# Altium footprint library heromap.PcbLib: 593 footprints (part 27 of 38)
Each footprint in its own frame and in the unit in brackets; x right, y up, seen from the top. Pads: shape width x height; smd on the part's side, far side on the other; paste and mask are expansions set on the pad; w line width, h text height; cw(c..) or ccw(c..) is an arc to the next point about the centre after c.
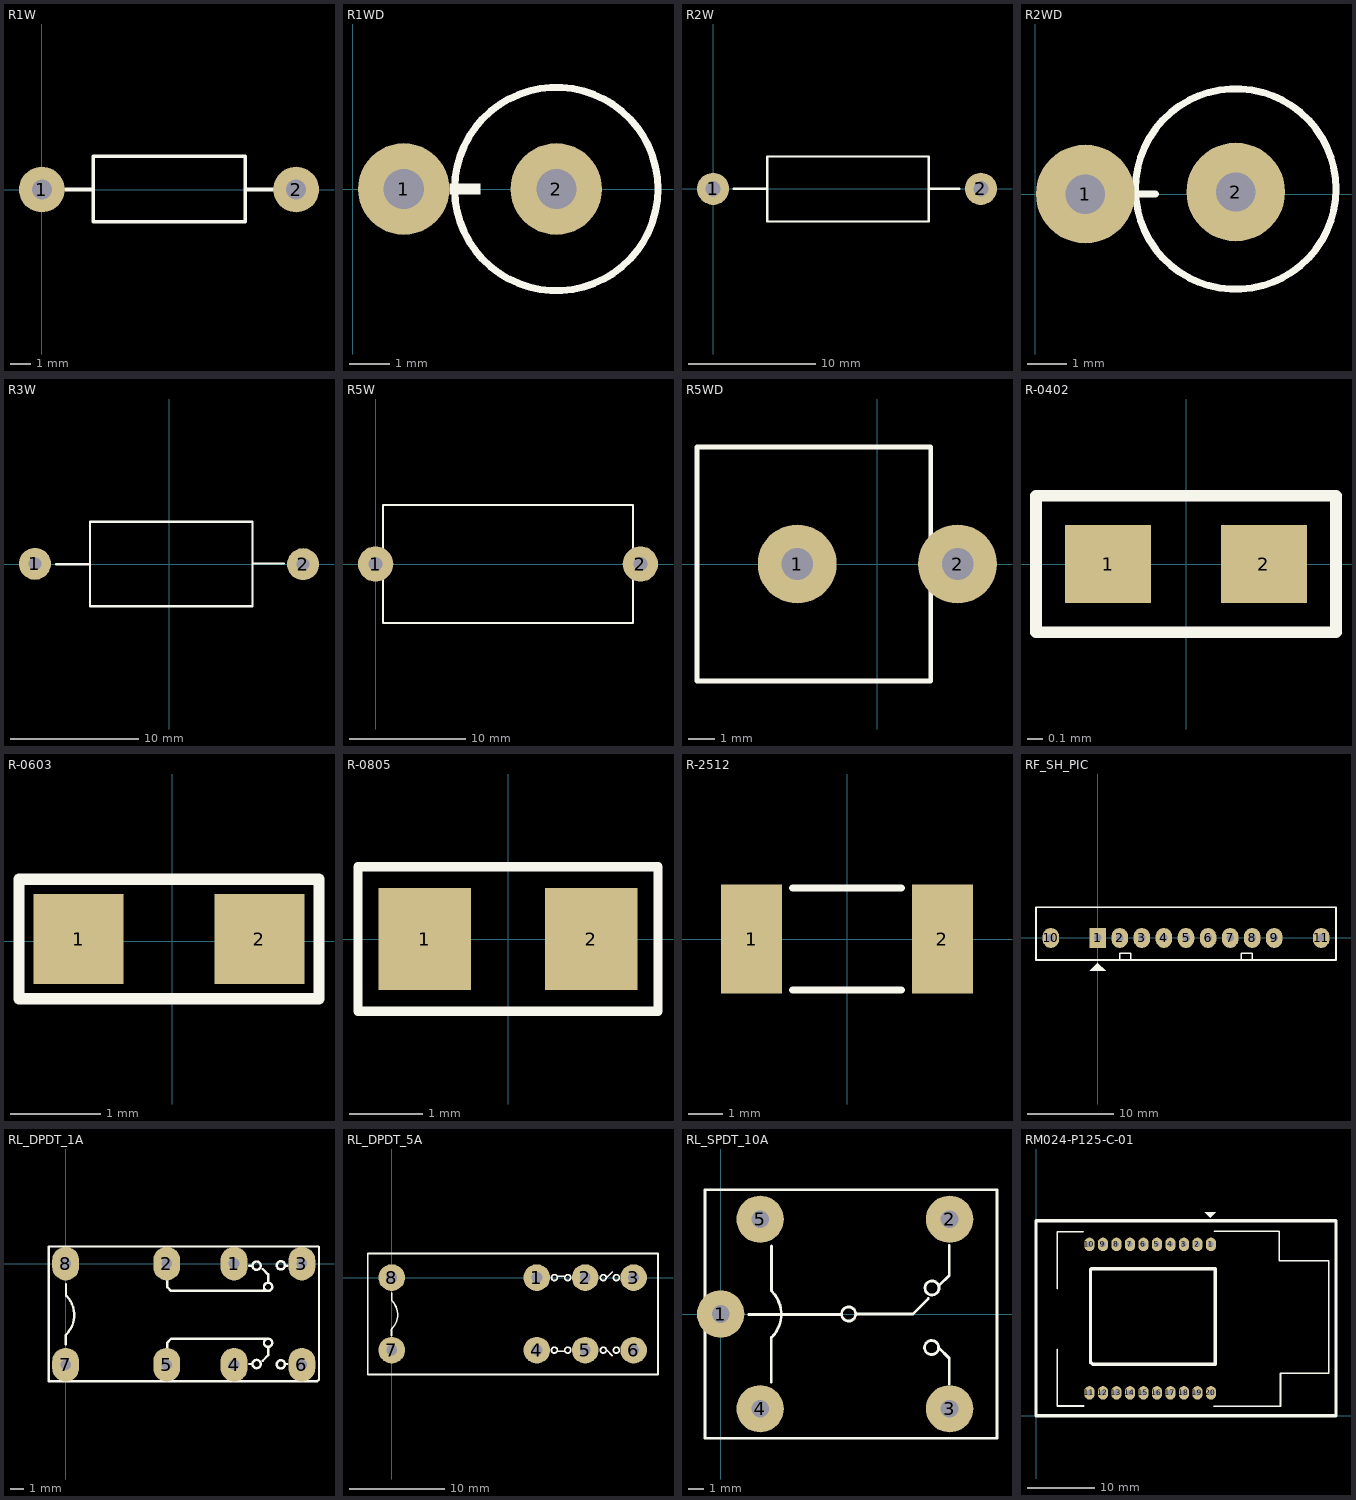
[diagram p26: the footprints below, top view; thin cyan lines are the x and y axes]

## R1W [mil] "R 1W, 2 pin, 500mil"
height 100
pads (2):
  round 90 hole 39.37: 1(0,0) 2(500,0)
Top Overlay:
  lines w7: 46,0 101,0 ; 400,0 460,0 ; 101,0 101,65 400,65 400,-63 101,-63 101,0

## R1WD [mil] "R 1W, 2 pin, 500mil"
height 100
pads (2):
  round 90 hole 39.37: 1(50,0) 2(200,0)
Top Overlay:
  circle w7: c200,0 r100
  region: 125,5 125,-5 95,-5 95,5

## R2W [mm] "R2W, 2 pin, 700mil"
height 5.08
pads (2):
  round 2.54 hole 1.2: 1(0,0) 2(21.107,0)
Top Overlay:
  lines w0.178: 1.626,0 4.267,0 ; 17.018,0 19.406,0 ; 4.267,0 4.267,2.54 16.993,2.54 16.993,-2.565 4.267,-2.565 4.267,0
3D body "SW3dPS-AXIAL_RESISTOR(3W).STEP": height 8.3, standoff -2, extent -0.6,-3.3 21.6,3.3

## R2WD [mm] "R2W, 2 pin, 700mil"
height 5.08
pads (2):
  round 2.5 hole 1: 1(1.27,0) 2(5.08,0.051)
Top Overlay:
  circle w0.178: c5.08,0.127 r2.54
  lines w0.178: 2.159,0 3.048,0

## R3W [mm] "R2W, 2 pin, 700mil"
height 5.08
pads (2):
  round 2.5 hole 1: 1(-10.503,0.013) 2(10.503,-0.013)
Top Overlay:
  lines w0.178: -8.826,-0.013 -6.185,-0.013 ; 6.566,0.038 9.004,0.038 ; -6.185,-3.315 6.54,-3.315 6.54,3.315 -6.185,3.315 -6.185,0.038 -6.185,-3.315
3D body "SW3dPS-AXIAL_RESISTOR(3W).STEP": height 8.3, standoff -2, extent -11.113,-3.289 11.087,3.311

## R5W [mil] "R5W , 2 pin, 400 x 950mil"
height 400
pads (2):
  round 120 hole 47.24: 1(0,0) 2(900,0)
Top Overlay:
  lines w7: 25,-200 875,-200 875,200 25,200 25,-200
3D body "User Library-5W Resistor.STEP": height 362.6, standoff -98.43, extent -84.69,-190 954.68,191.89

## R5WD [mm] "R5W , 2 pin, 300 x 600 mil"
height 10.16
pads (2):
  round 3 hole 1.2: 1(-3.048,0) 2(3.048,0)
Top Overlay:
  lines w0.178: -6.858,-4.445 -6.858,4.445 2.032,4.445 2.032,-4.445 -6.858,-4.445
3D body "SW3dPS-5W Res.STEP": height 23.05, standoff -2.4, extent -8.648,-5.08 4.432,4.92

## R-0402 [mil]
pads (2):
  rect 22x20 smd: 1(-20,0) 2(20,0)
Top Overlay:
  lines w3: -38.5,-17.5 38.5,-17.5 38.5,17.5 -38.5,17.5 -38.5,-17.5
3D body: height 11.81, standoff 0.98, extent -20,-10 20,10
3D body: height 12.2, standoff 0, extent -21.5,-10.5 -18.5,10.5
3D body: height 12.2, standoff 0, extent 18.49,-10.51 21.49,10.49

## R-0603 [mm] "Chip Capacitor; Body 1.6 x 0.8 mm (LxW typ)"
height 0.87
pads (2):
  rect 1x1 smd: 1(-1.041,0.025) 2(0.965,0.025)
Top Overlay:
  lines w0.127: -1.702,-0.635 1.626,-0.635 1.626,0.686 -1.702,0.686 -1.702,-0.635
3D body "User Library-RESC1608X05N.STEP": height 0.45, standoff 0, extent -0.8,-0.399 0.75,0.451

## R-0805 [mil] "Compoment SMD 80x50mil"
height 50
pads (2):
  rect 50x55 smd: 1(-45,0) 2(45,0)
Top Overlay:
  lines w5: -81,-39 81,-39 81,39 -81,39 -81,-39
3D body "SW3dPS-0805 SMD Resistor.STEP": height 30.79, standoff 0, extent -39.36,-24.6 39.38,24.61

## R-2512 [mm] "Chip Resistor; Body 6.3 x 3.2 mm (LxW typ) - C"
height 0.6
pads (2):
  rect 1.8x3.2 smd: 1(-2.8,0) 2(2.8,0)
Top Overlay:
  lines w0.2: -1.6,-1.5 1.6,-1.5 ; -1.6,1.5 1.6,1.5
3D body "User Library-res2512_body.STEP": height 0.62, standoff 0, extent -3.159,-1.6 3.16,1.6

## RF_SH_PIC [mil]
pads (11):
  rect 75x90 hole 34: 1(0,0)
  oval 75x90 hole 34: 2(100,0) 3(200,0) 4(300,0) 5(400,0) 6(500,0) 7(600,0) 8(700,0) 9(800,0) 10(-212.6,0) 11(1012.6,0)
Top Overlay:
  region: -35.5,-149.5 35.5,-149.5 0.5,-114.5 0.5,-113.5
  lines w7: 100,-99 100,-69 150,-69 150,-99 ; 651,-99 651,-69 701,-69 701,-99 ; -280,-100 1080,-100 1080,140 -280,140 -280,-100

## RL_DPDT_1A [mil] "Reley DPDT, 8 pin, 1A, W400mil, L800mil,H 300mil"
height 300
pads (8):
  oval 80x100 hole 32: 1(500,0) 2(300,0) 3(701,0) 4(500,-300) 5(300,-300) 6(701,-300) 7(0,-300) 8(0,0)
Top Overlay:
  circle w7: c638.76,-299 r12.24
  circle w7: c566.76,-298 r12.24
  circle w7: c600.76,-235 r12.24
  circle w7: c600.76,-69 r12.24
  circle w7: c566.76,-6 r12.24
  circle w7: c638.76,-5 r12.24
  lines w7: 0,-239 0,-212 ; 1,-211 ccw(c-56.5,-152.5) 2,-95 ; 1,-94 1,-61 ; 302,-255 302,-234 313,-223 599,-223 ; 302,-42 302,-70 313,-81 599,-81 ; 544,-298 552,-298 ; 544,-6 552,-6 ; 585,-288 601,-272 601,-249 ; 585,-16 601,-32 601,-55 ; 653,-298 658,-298 ; 653,-6 658,-6 ; -50,-349 -50,51 750,51 752,49 752,-344 747,-349 -50,-349
3D body "SW3dPS-DSY2Y.STEP": height 484.25, standoff -118.11, extent -59.45,-340 759.45,45.83

## RL_DPDT_5A [mil] "Reley DPDT, 8 pin, 5A, W500mil, L1100mil,H 950mil"
height 300
pads (8):
  round 110 hole 45: 1(600,0) 2(800,0) 3(1000,0) 4(600,-300) 5(800,-300) 6(1000,-300) 7(0,-300) 8(0,0)
Top Overlay:
  circle w7: c928.76,0 r12.24
  circle w7: c874.76,0 r12.24
  circle w7: c727.76,0 r12.24
  circle w7: c672.76,0 r12.24
  circle w7: c672.76,-300 r12.24
  circle w7: c727.76,-300 r12.24
  circle w7: c874.76,-300 r12.24
  circle w7: c928.76,-300 r12.24
  lines w7: -1,-240 -1,-213 ; 0,-212 ccw(c-57.5,-153.5) 1,-96 ; 0,-95 0,-62 ; 687,-305 716,-305 ; 687,5 716,5 ; 888,-299 912,-323 ; 888,-1 912,23 ; -99,-401 -99,100 1101,100 1101,-401 -99,-401

## RL_SPDT_10A [mil] "Relay SPDT, 5 pin, 10A,W 650mil, L 800mil, H 800mil"
height 800
pads (5):
  round 120 hole 45: 1(0,0) 2(580,240) 3(580,-240) 4(100,-240) 5(100,240)
Top Overlay:
  circle w7: c324.2,0 r17.8
  circle w7: c535.2,66 r17.8
  circle w7: c534.2,-85 r17.8
  lines w7: 71,-1 304,-1 ; 128,-173 128,-60 ; 129,-59 ccw(c71.5,-0.5) 130,57 ; 129,58 129,172 ; 344,0 487,0 526,39 ; 552,-85 579,-112 579,-178 ; 553,72 579,98 579,174 ; -40,-315 700,-315 700,315 -40,315 -40,-315
3D body: height 39.37, standoff -78.74, extent 564.38,224.29 595.75,255.73
3D body: height 39.37, standoff -78.74, extent 564.38,-255.71 595.75,-224.27
3D body: height 39.37, standoff -78.74, extent 84.38,-255.71 115.75,-224.27
3D body: height 39.37, standoff -78.74, extent -15.62,-15.71 15.75,15.73
3D body: height 39.37, standoff -78.74, extent 84.38,224.29 115.75,255.73
3D body: height 629.92, standoff 19.68, extent -40,-315 700,315

## RM024-P125-C-01 [mm]
height 10
pads (20):
  oval 1.5x2 hole 0.8: 1(25.918,25.417) 2(23.918,25.417) 3(21.918,25.417) 4(19.918,25.417) 5(17.918,25.417) 6(15.918,25.417) 7(13.918,25.417) 8(11.918,25.417) 9(9.918,25.417) 10(7.918,25.417) 11(7.918,3.417) 12(9.918,3.417) 13(11.918,3.417) 14(13.918,3.417) 15(15.918,3.417) 16(17.918,3.417) 17(19.918,3.417) 18(21.918,3.417) 19(23.918,3.417) 20(25.918,3.417)
Top Overlay:
  region: 24.981,30.213 26.657,30.213 25.819,29.375
  lines w0.254: 3.146,1.494 3.146,9.85 ; 3.146,18.867 3.15,27.28 7.006,27.28 ; 3.171,1.468 7.057,1.468 ; 26.361,1.443 36.22,1.443 36.22,6.325 43.383,6.325 43.383,22.987 36.043,22.987 36.043,27.351 26.412,27.351
  lines w0.508: 8.073,21.763 8.073,7.971 8.403,7.641 26.514,7.641 26.539,7.666 26.539,21.814 8.149,21.814 ; 0,0 44.45,0 44.45,28.9 0,28.9 0,0
3D body: height 5, standoff -1, extent 7.429,25.018 8.225,25.816
3D body: height 5, standoff -1, extent 9.429,25.018 10.225,25.816
3D body: height 5, standoff -1, extent 11.429,25.018 12.225,25.816
3D body: height 5, standoff -1, extent 13.429,25.018 14.225,25.816
3D body: height 5, standoff -1, extent 15.429,25.018 16.225,25.816
3D body: height 5, standoff -1, extent 17.429,25.018 18.225,25.816
3D body: height 5, standoff -1, extent 19.429,25.018 20.225,25.816
3D body: height 5, standoff -1, extent 21.429,25.018 22.225,25.816
3D body: height 5, standoff -1, extent 23.429,25.018 24.225,25.816
3D body: height 5, standoff -1, extent 25.429,25.018 26.225,25.816
3D body: height 5, standoff -1, extent 23.429,3.018 24.225,3.816
3D body: height 5, standoff -1, extent 25.429,3.018 26.225,3.816
3D body: height 5, standoff -1, extent 19.429,3.018 20.225,3.816
3D body: height 5, standoff -1, extent 21.429,3.018 22.225,3.816
3D body: height 5, standoff -1, extent 15.429,3.018 16.225,3.816
3D body: height 5, standoff -1, extent 17.429,3.018 18.225,3.816
3D body: height 5, standoff -1, extent 11.429,3.018 12.225,3.816
3D body: height 5, standoff -1, extent 13.429,3.018 14.225,3.816
3D body: height 5, standoff -1, extent 9.429,3.018 10.225,3.816
3D body: height 5, standoff -1, extent 7.429,3.018 8.225,3.816
3D body: height 6, standoff 5.5, extent 3.073,0.813 35.204,27.965
3D body: height 7, standoff 6, extent 3.124,1.422 43.485,27.457
3D body: height 8, standoff 6.5, extent 6.16,4.191 29.147,24.968